# Altium integrated library 00Lib.IntLib: 286 symbols (part 2 of 2) (continued)
## STM32G431C6T6
designator U?
No Description Available; Manufacturer: ST(意法半导体); CompType: MCU; Code: STM32G431C6T6; DistributorCode: C529354; Package: LQFP-48
footprint LQFP48-7x7mm
part A pins: 2 PC13 (io), 3 PC14-OSC32_IN (io), 4 PC15-OSC32_OUT (io), 5 PF0-OSC_IN (io), 6 PF1-OSC_OUT (io), 7 PG10-NRST (io), 8 PA0 (io), 9 PA1 (io), 10 PA2 (io), 11 PA3 (io), 12 PA4 (io), 13 PA5 (io), 14 PA6 (io), 15 PA7 (io), 16 PB0 (io), 17 PB1 (io), 18 PB2 (io), 22 PB10 (io), 25 PB11 (io), 26 PB12 (io), 27 PB13 (io), 28 PB14 (io), 29 PB15 (io), 30 PA8 (io), 31 PA9 (io), 32 PA10 (io), 33 PA11 (io), 34 PA12 (io), 37 PA13 (io), 38 PA14 (io), 39 PA15 (io), 40 PB3 (io), 41 PB4 (io), 42 PB5 (io), 43 PB6 (io), 44 PB7 (io), 45 PB8-BOOT0 (io), 46 PB9 (io)
part B pins: 1 VBAT (power), 19 VSSA (power), 20 VREF+ (power), 21 VDDA (power), 23 VSS (power), 24 VDD (power), 35 VSS (power), 36 VDD (power), 47 VSS (power), 48 VDD (power)
part A text: 1 of 2
part B text: 2 of 2

## STM32G431CBT6
designator U?
No Description Available; Manufacturer: ST(意法半导体); Code: STM32G431CBT6A; CompType: MCU; DistributorCode: C529354; Package: LQFP-48
footprint LQFP48-7x7mm
part A pins: 2 PC13 (io), 3 PC14-OSC32_IN (io), 4 PC15-OSC32_OUT (io), 5 PF0-OSC_IN (io), 6 PF1-OSC_OUT (io), 7 PG10-NRST (io), 8 PA0 (io), 9 PA1 (io), 10 PA2 (io), 11 PA3 (io), 12 PA4 (io), 13 PA5 (io), 14 PA6 (io), 15 PA7 (io), 16 PB0 (io), 17 PB1 (io), 18 PB2 (io), 22 PB10 (io), 25 PB11 (io), 26 PB12 (io), 27 PB13 (io), 28 PB14 (io), 29 PB15 (io), 30 PA8 (io), 31 PA9 (io), 32 PA10 (io), 33 PA11 (io), 34 PA12 (io), 37 PA13 (io), 38 PA14 (io), 39 PA15 (io), 40 PB3 (io), 41 PB4 (io), 42 PB5 (io), 43 PB6 (io), 44 PB7 (io), 45 PB8-BOOT0 (io), 46 PB9 (io)
part B pins: 1 VBAT (power), 19 VSSA (power), 20 VREF+ (power), 21 VDDA (power), 23 VSS (power), 24 VDD (power), 35 VSS (power), 36 VDD (power), 47 VSS (power), 48 VDD (power)
part B text: 2 of 2

## STM32G431KBT6
designator U?
No Description Available; Manufacturer: ST(意法半导体); CompType: MCU; Code: STM32G431KBT6; DistributorCode: C529357; Package: LQFP-32
footprint LQFP-32
part A pins: 2 PF0-OSC_IN (io), 3 PF1-OSC_OUT (io), 4 PG10-NRST (io), 5 PA0 (io), 6 PA1 (io), 7 PA2 (io), 8 PA3 (io), 9 PA4 (io), 10 PA5 (io), 11 PA6 (io), 12 PA7 (io), 13 PB0 (io), 18 PA8 (io), 19 PA9 (io), 20 PA10 (io), 21 PA11 (io), 22 PA12 (io), 23 PA13 (io), 24 PA14 (io), 25 PA15 (io), 26 PB3 (io), 27 PB4 (io), 28 PB5 (io), 29 PB6 (io), 30 PB7 (io), 31 PB8-BOOT0 (io)
part B pins: 1 VDD (power), 14 VSSA (power), 15 VDDA (power), 16 VSS (power), 17 VDD (power), 32 VSS (power)
part A text: 1 of 2
part B text: 2 of 2

## STM32G431KBU6
designator U?
No Description Available; Manufacturer: ST(意法半导体); CompType: MCU; Code: STM32G431KBU6; DistributorCode: C529358; Package: UFQFPN-32
footprint UFQFPN-32
part A pins: 2 PF0-OSC_IN (io), 3 PF1-OSC_OUT (io), 4 PG10-NRST (io), 5 PA0 (io), 6 PA1 (io), 7 PA2 (io), 8 PA3 (io), 9 PA4 (io), 10 PA5 (io), 11 PA6 (io), 12 PA7 (io), 13 PB0 (io), 18 PA8 (io), 19 PA9 (io), 20 PA10 (io), 21 PA11 (io), 22 PA12 (io), 23 PA13 (io), 24 PA14 (io), 25 PA15 (io), 26 PB3 (io), 27 PB4 (io), 28 PB5 (io), 29 PB6 (io), 30 PB7 (io), 31 PB8-BOOT0 (io)
part B pins: 1 VDD (power), 14 VSSA (power), 15 VDDA (power), 16 VSS (power), 17 VDD (power), 32 VSS (power)
part A text: 1 of 2
part B text: 2 of 2

## STM32G431VBT6
designator U?
No Description Available; Manufacturer: ST(意法半导体); CompType: MCU; Code: STM32G431VBT6; DistributorCode: C529359; Package: LQFP-100
footprint LQFP100-14x14mm
part A pins: 7 PC13 (io), 8 PC14-OSC32_IN (io), 9 PC15-OSC32_OUT (io), 15 PC0 (io), 16 PC1 (io), 17 PC2 (io), 18 PC3 (io), 20 PA0 (io), 21 PA1 (io), 22 PA2 (io), 25 PA3 (io), 26 PA4 (io), 27 PA5 (io), 28 PA6 (io), 29 PA7 (io), 30 PC4 (io), 31 PC5 (io), 32 PB0 (io), 33 PB1 (io), 34 PB2 (io), 47 PB10 (io), 50 PB11 (io), 51 PB12 (io), 52 PB13 (io), 53 PB14 (io), 54 PB15 (io), 55 PD8 (io), 56 PD9 (io), 57 PD10 (io), 58 PD11 (io), 59 PD12 (io), 60 PD13 (io), 61 PD14 (io), 62 PD15 (io), 65 PC6 (io), 66 PC7 (io), 67 PC8 (io), 68 PC9 (io), 69 PA8 (io), 70 PA9 (io), 71 PA10 (io), 72 PA11 (io), 73 PA12 (io), 76 PA13 (io), 77 PA14 (io), 78 PA15 (io), 79 PC10 (io), 80 PC11 (io), 81 PC12 (io), 82 PD0 (io), 83 PD1 (io), 84 PD2 (io), 85 PD3 (io), 86 PD4 (io), 87 PD5 (io), 88 PD6 (io), 89 PD7 (io), 90 PB3 (io), 91 PB4 (io), 92 PB5 (io), 93 PB6 (io), 94 PB7 (io), 95 PB8-BOOT0 (io), 96 PB9 (io)
part B pins: 1 PE2 (io), 2 PE3 (io), 3 PE4 (io), 4 PE5 (io), 5 PE6 (io), 10 PF9 (io), 11 PF10 (io), 12 PF0-OSC_IN (io), 13 PF1-OSC_OUT (io), 14 PG10-NRST (io), 19 PF2 (io), 38 PE7 (io), 39 PE8 (io), 40 PE9 (io), 41 PE10 (io), 42 PE11 (io), 43 PE12 (io), 44 PE13 (io), 45 PE14 (io), 46 PE15 (io), 97 PE0 (io), 98 PE1 (io)
part C pins: 6 VBAT (power), 23 VSS (power), 24 VDD (power), 35 VSSA (power), 36 VREF+ (power), 37 VDDA (power), 48 VSS (power), 49 VDD (power), 63 VSS (power), 64 VDD (power), 74 VSS (power), 75 VDD (power), 99 VSS (power), 100 VDD (power)
part A text: 1 of 3
part B text: 2 of 3
part C text: 3 of 3

## TLP521GB-S
designator O?, comment TLP521
光耦; Manufacturer: UMW(友台半导体); Code: TLP521GB-S; DistributorCode: C364143; Package: SMD-4P; A_Code: -; A_Manufacturer: -; CompType: 光耦; A_ComType: -
footprint DIP-4 (DIP; 4 Leads; Row Spacing 7.62 mm; Pitch 2.54 mm)
footprint SMD-4
pins: 1 A "Anode", 2 K "Cathode", 3 E "Emitter", 4 C "Collector"

## TPL5010DDCR
designator U?
看门狗; Manufacturer: TI(德州仪器); Code: TPL5010DDCR; DistributorCode: C473912; Package: SOT23-Thin-6; CompType: 看门狗; A_Code: -; A_ComType: -; A_Manufacturer: -
footprint DDC0006A_N
pins: 1 VDD (power), 2 GND (power), 3 DELAY_M_RST (in), 4 DONE (in), 5 WAKE (out), 6 RST_N (out)

## TPS22860DBVR
designator U?
负载开关; Manufacturer: TI(德州仪器); CompType: 模拟开关; Code: TPS22860DBVR; DistributorCode: C132005; Package: SOT23-6
footprint DBV0006A_N
pins: 1 VOUT (power), 2 GND (power), 3 NC, 4 VIN (power), 5 VBIAS (in), 6 ON (in)

## ULN2003BDR
designator U?
footprint D16_TEX
pins: 1 1B (in), 2 2B (in), 3 3B (in), 4 4B (in), 5 5B (in), 6 6B (in), 7 7B (in), 8 E, 9 COM, 10 7C (out), 11 6C (out), 12 5C (out), 13 4C (out), 14 3C (out), 15 2C (out), 16 1C (out)

## W25Q16
designator U?
存储器接口类型 SPI-双/四通道I / O / 存储器容量 16Mb（2M x 8） / 工作电压 2.7V〜3.6V / 存储器类型 非易失性; Manufacturer: WINBOND(华邦); Code: W25Q16JVSSIQ; CompType: FLASH存储器; DistributorCode: C82317; Package: SOIC-8; A_Code: -; A_ComType: -; A_Manufacturer: -
footprint D8_TEX
pins: 1 ~{CS} (power), 2 DO/IO1 (power), 3 IO2 (power), 4 VSS, 5 DI/IO0, 6 CLK, 7 IO3, 8 VDD


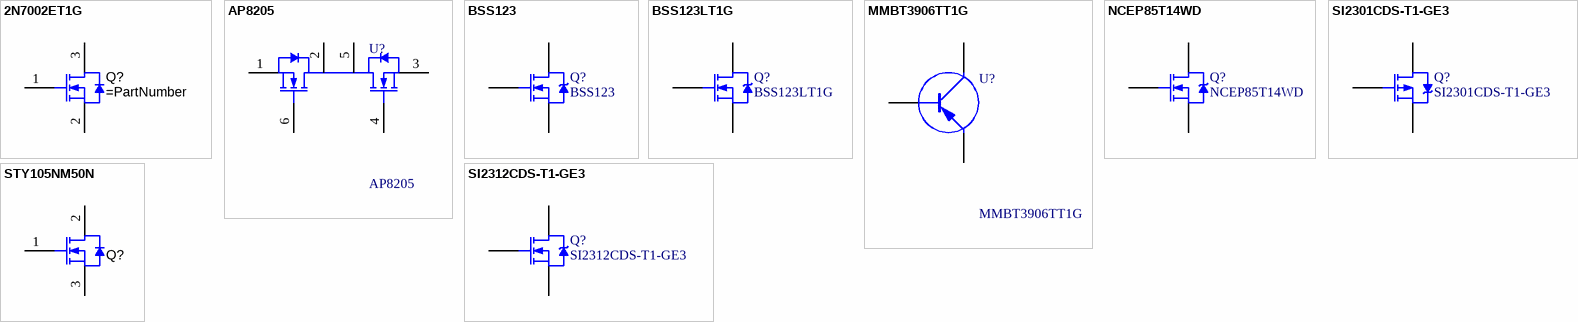
[diagram p10: symbols 2N7002ET1G to STY105NM50N]

## 2N7002ET1G
designator Q?
MOSFET, N-CH, 60V, 0.26A, SOT-23; Manufacturer: ON Semiconductor; Code: 2N7002ET1G; CompType: MOSFET; Package: SOT-23-3
footprint SOT-23 (SOT23, 3-Leads, Body 2.9x1.3mm, Pitch 0.95mm, Lead Span 2.5mm, IPC Medium Density)
pins: 1 G, 2 S, 3 D

## AP8205
designator U?
漏源电压（Vdss） 20V / 连续漏极电流（Id）（25°C 时） 6A / 栅源极阈值电压 1.2V @ 250uA / 漏源导通电阻 24mΩ @ 6A,4.5V / 最大功率耗散（Ta=25°C） 1.14W / 类型 双N沟道(共漏); Manufacturer: ALLPOWER(铨力); CompType: MOS(场效应管); Code: AP8205; DistributorCode: C360340; Package: SOT23-6
footprint DBV0006A_N
pins: 1 S1, 2 D1/D2, 3 S2, 4 G2, 5 D1/D2, 6 G1

## BSS123
designator Q?
漏源电压（Vdss） 100V / 连续漏极电流（Id）（25°C 时） 170mA / 栅源极阈值电压 2V @ 1mA / 漏源导通电阻 6Ω @ 170mA,10V / 最大功率耗散（Ta=25°C） 360mW / 类型 N沟道 /; Manufacturer: CJ（江苏长电/长晶）; CompType: MOS(场效应管); A_Code: -; A_Manufacturer: -; Code: BSS123; DistributorCode: C79015; Package: SOT-23-3; A_ComType: -
footprint SOT-23
pins: 1 G, 2 S, 3 D

## BSS123LT1G
designator Q?
漏源电压（Vdss） 100V / 连续漏极电流（Id）（25°C 时） 170mA / 栅源极阈值电压 2.8V @ 1mA / 漏源导通电阻 6Ω @ 100mA,10V / 最大功率耗散（Ta=25°C） 225mW / 类型 N沟道; Manufacturer: ON(安森美); Code: BSS123; CompType: MOS(场效应管); A_Code: -; A_Manufacturer: -; DistributorCode: C78755; Package: SOT-23-3; A_ComType: -
footprint SOT-23
pins: 1 G, 2 S, 3 D

## MMBT3906TT1G
designator U?
额定功率 200mW / 集电极电流Ic 200mA / 集射极击穿电压Vce 40V / 晶体管类型 PNP; Manufacturer: ON(安森美); Code: MMBT3906TT1G; DistributorCode: C82042; Package: SOT23-3; CompType: PNP
footprint SOT-23(SOT-23-3)
pins: 1 B, 2 E, 3 C

## NCEP85T14WD
designator Q?
漏源电压（Vdss） 85V / 连续漏极电流（Id）（25°C 时） 140A / 栅源极阈值电压 3.1V @ 250uA / 漏源导通电阻 4mΩ @ 70A,10V / 最大功率耗散（Ta=25°C） 360mW / 类型 N沟道 /; Manufacturer: 无锡新洁能; CompType: MOS(场效应管); A_Code: -; A_Manufacturer: -; Code: NCEP85T14WD; DistributorCode: -; Package: TO-263-2L; A_ComType: -
footprint TO-263T-2L (D2-PAK, 3-Pads, Body 7.80x8.50mm (max), IPC Medium Density)
pins: 1 G, 2 S, 3 D

## SI2301CDS-T1-GE3
designator Q?
漏源电压（Vdss） -20V / 连续漏极电流（Id）（25°C 时） 3.1A / 栅源极阈值电压 1V @ 250uA / 漏源导通电阻 112mΩ @ 2.8A,4.5V / 最大功率耗散（Ta=25°C） 860mW / 类型 P沟道; Manufacturer: VISHAY(威世); CompType: MOS(场效应管); A_Code: -; A_Manufacturer: -; Code: SI2301CDS-T1-GE3; DistributorCode: C10487; Package: SOT-23-3; A_ComType: -
footprint SOT-23(SOT-23-3)
pins: 1 G, 2 S, 3 D

## SI2312CDS-T1-GE3
designator Q?
漏源电压（Vdss） 20V / 连续漏极电流（Id）（25°C 时） 6A(Tc) / 栅源极阈值电压 1V @ 250uA / 漏源导通电阻 31.8mΩ @ 5A,4.5V / 最大功率耗散（Ta=25°C） 2.1W(Tc) / 类型 N沟道; Manufacturer: VISHAY(威世); CompType: MOS(场效应管); A_Code: -; A_Manufacturer: -; Code: SI2312CDS-T1-GE3; DistributorCode: C142518; Package: SOT-23-3; A_ComType: -
footprint SOT-23(SOT-23-3)
pins: 1 G, 2 S, 3 D

## STY105NM50N
designator Q?, comment STY145N65M5  (value not drawn)
MOSFET N-CH 650V 138A MAX247; Manufacturer: STMicroelectronics; Alternate Manufacturer: None; U/M: EA; ChType: N; VdsMax_V: 650; Value1: ? ohm; Value2: 326 nC; QgTyp_nC: 326; IdsMax_A: 110; AEC Category: Q101; SymbolVersion: 2008-07-28; CompType: MOSFET; PartNumber: STY145N65M5; PackageReference: TO-247; Value: 650V; RoHS: Y; MountType: TH; Published: 2008-06-19; Publisher: Texas Instruments; LatestRevisionDate: 2016-03-28; LatestRevisionNote: Added parts.; ComponentLink1Description: Datasheet link; Supplier 1: Digi-Key; Supplier Part Number 1: 497-13638-5-ND; AEC Qualified: N
footprint TO-247
pins: 1 G, 2 D, 3 S
1 alternate drawing of the same symbol


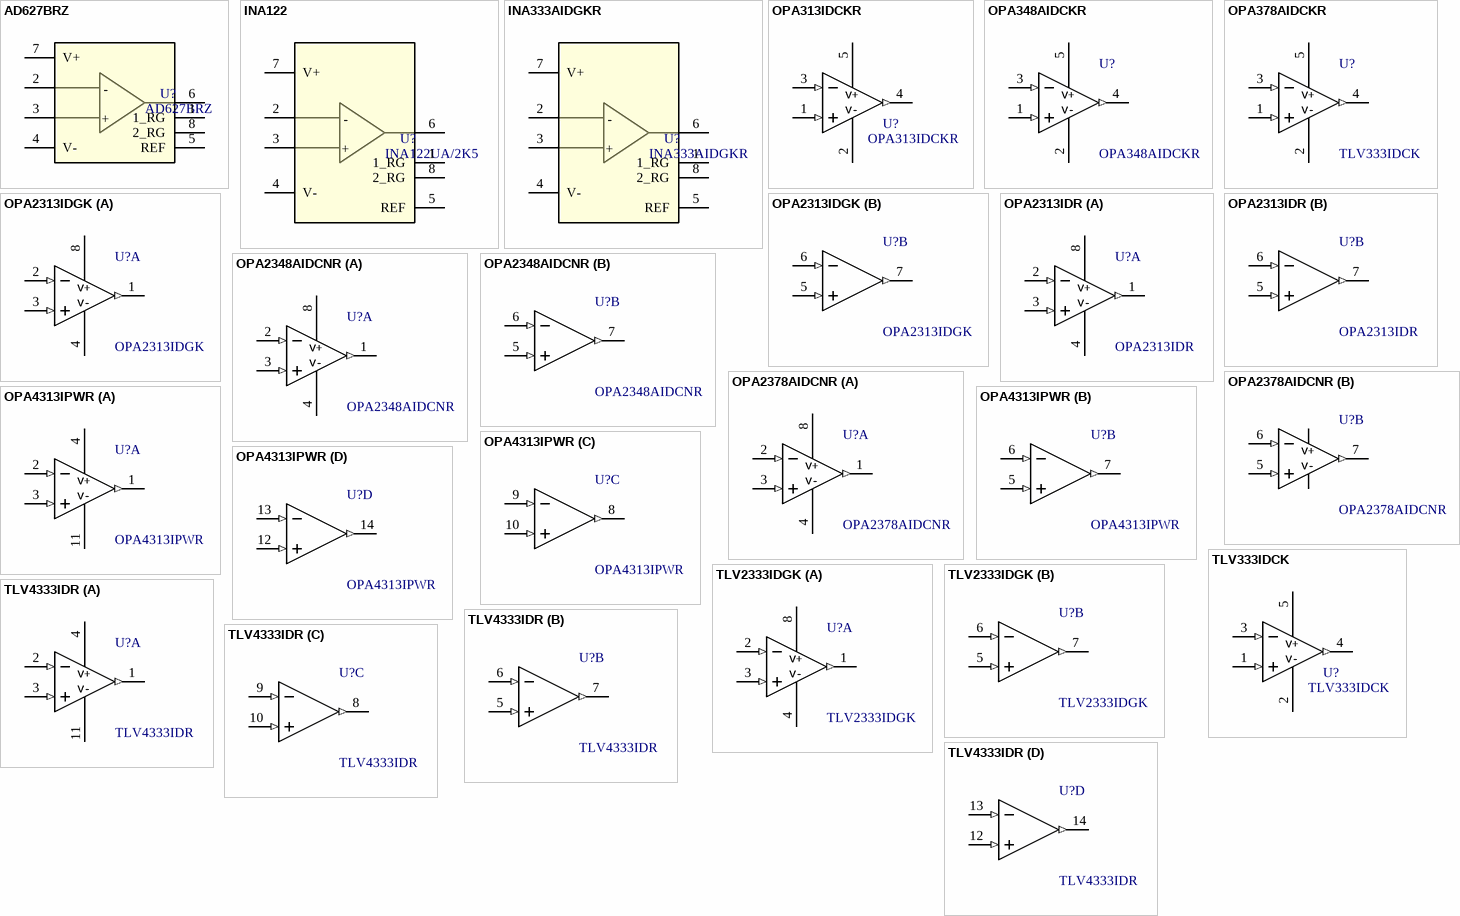
[diagram p11: symbols AD627BRZ to TLV4333IDR]

## AD627BRZ
designator U?
增益带宽积（GBP） 80kHz(-3dB) / 放大器组数 1 / 输出类型 Rail-to-Rail / 运放类型 Instrumentation / 各通道功耗 - / 压摆率（SR） 0.06 V/us / 工作温度 -40℃~85℃ / 电源电压 2.2V ~ 36V, ±1.1V ~ 18V; Manufacturer: TI(德州仪器); CompType: 运放; DistributorCode: C19137; Package: SOIC-8_150mil; Code: AD627BRZ; A_Code: -; A_Manufacturer: -; A_ComType: -
footprint SOP-8_150mil
pins: 1 1_RG, 2 VIN- (hiz), 3 VIN+ (hiz), 4 V- (power), 5 REF, 6 VOUT, 7 V+ (power), 8 2_RG
text: +

## INA122
designator U?, comment INA122UA/2K5
放大器组数 1 / 输出类型 - / 运放类型 Instrumentation / 各通道功耗 60uA / 压摆率（SR） 0.16 V/us / 工作温度 -40℃~85℃ / 电源电压 2.2V ~ 36V, -0.9V/+1.3V ~ 18V /; Manufacturer: TI(德州仪器); CompType: 运放; DistributorCode: C40768; Package: SOIC-8_150mil; Code: INA122UA/2K5; A_Code: -; A_Manufacturer: -; A_ComType: -
footprint SOP-8_150mil
pins: 1 1_RG, 2 VIN- (hiz), 3 VIN+ (hiz), 4 V- (power), 5 REF, 6 VOUT, 7 V+ (power), 8 2_RG
text: +

## INA333AIDGKR
designator U?
输出类型 Rail-to-Rail / 运放类型 Instrumentation / 各通道功耗 75uA / 压摆率（SR） 0.16 V/us / 工作温度 -40°C ~ 125°C / 电源电压 1.8V ~ 5.5V, ±0.9V ~ 2.75V; Manufacturer: TI(德州仪器); CompType: 运放; DistributorCode: C19450; Package: VSSOP8; Code: INA333AIDGKR; A_Code: -; A_Manufacturer: -; A_ComType: -
footprint DGK8_TEX-L
pins: 1 1_RG, 2 VIN- (hiz), 3 VIN+ (hiz), 4 V- (power), 5 REF, 6 VOUT, 7 V+ (power), 8 2_RG
text: +

## OPA313IDCKR
designator U?
增益带宽积（GBP） 1MHz / 放大器组数 1 / 输出类型 Rail-to-Rail / 运放类型 General Purpose / 各通道功耗 50uA / 压摆率（SR） 0.5 V/us / 工作温度 -40°C ~ 125°C / 电源电压 1.8V ~ 5.5V; Manufacturer: TI(德州仪器); CompType: 运放; DistributorCode: C129150; Package: SC-70-5; Code: OPA313IDCKR; A_Code: -; A_Manufacturer: -; A_ComType: -
footprint DCK0005A_N
pins: 1 IN+ (in), 2 V- (power), 3 IN- (in), 4 OUT (out), 5 V+ (power)

## OPA348AIDCKR
designator U?
增益带宽积（GBP） 1MHz / 放大器组数 1 / 输出类型 Rail-to-Rail / 运放类型 General Purpose / 各通道功耗 - / 压摆率（SR） 0.5 V/us / 工作温度 -40°C ~ 125°C / 电源电压 2.1V ~ 5.5V; Manufacturer: TI(德州仪器); CompType: 运放; DistributorCode: C353160; Package: SC-70-5; Code: OPA348AIDCKR
footprint DCK0005A_N
pins: 1 IN+ (in), 2 V- (power), 3 IN- (in), 4 OUT (out), 5 V+ (power)

## OPA378AIDCKR
designator U?, comment TLV333IDCK
Manufacturer: TI(德州仪器); Code: OPA378AIDCKR; CompType: 运放; DistributorCode: C2058269; Package: SC-70-5
footprint DCK0005A_N
pins: 1 IN+ (in), 2 V- (power), 3 IN- (in), 4 OUT (out), 5 V+ (power)

## OPA2313IDGK
designator U?
增益带宽积（GBP） 1MHz / 放大器组数 2 / 输出类型 Rail-to-Rail / 运放类型 General Purpose / 各通道功耗 50uA / 压摆率（SR） 0.5 V/us / 工作温度 -40°C ~ 125°C / 电源电压 1.8V ~ 5.5V; Manufacturer: TI(德州仪器); CompType: 运放; DistributorCode: C1347995; Package: VSSOP-8; Code: OPA2313IDGK
footprint DGK8_TEX-L
part A pins: 1 OUT (out), 2 IN- (in), 3 IN+ (in), 4 V- (power), 8 V+ (power)
part B pins: 5 IN+ (in), 6 IN- (in), 7 OUT (out)

## OPA2313IDR
designator U?
增益带宽积（GBP） 1MHz / 放大器组数 2 / 输出类型 Rail-to-Rail / 运放类型 General Purpose / 各通道功耗 50uA / 压摆率（SR） 0.5 V/us / 工作温度 -40°C ~ 125°C / 电源电压 1.8V ~ 5.5V; Manufacturer: TI(德州仪器); CompType: 运放; DistributorCode: C132028; Package: SOIC-8; Code: OPA2313IDR
footprint SOP-8_150mil
part A pins: 1 OUT (out), 2 IN- (in), 3 IN+ (in), 4 V- (power), 8 V+ (power)
part B pins: 5 IN+ (in), 6 IN- (in), 7 OUT (out)

## OPA2348AIDCNR
designator U?
增益带宽积（GBP） 1MHz / 放大器组数 2 / 输出类型 Rail-to-Rail / 运放类型 General Purpose / 各通道功耗 - / 压摆率（SR） 0.5 V/us / 工作温度 -40°C ~ 125°C / 电源电压 2.1V ~ 5.5V; Manufacturer: TI(德州仪器); CompType: 运放; DistributorCode: C51564; Package: SOT-23-8; Code: OPA2348AIDCNR
footprint DCN8-L
part A pins: 1 OUT (out), 2 IN- (in), 3 IN+ (in), 4 V- (power), 8 V+ (power)
part B pins: 5 IN+ (in), 6 IN- (in), 7 OUT (out)

## OPA2378AIDCNR
designator U?
增益带宽积（GBP） 900kHz / 放大器组数 2 / 输出类型 Rail-to-Rail / 运放类型 Zero-Drift / 各通道功耗 - / 压摆率（SR） 0.4 V/us / 工作温度 -40°C ~ 125°C / 电源电压 2.2V ~ 5.5V, ±1.1V ~ 2.75V; Manufacturer: TI(德州仪器); CompType: 运放; DistributorCode: C133030; Package: VSSOP-8; Code: OPA2378AIDCNR
footprint DCN8-L
part A pins: 1 OUT (out), 2 IN- (in), 3 IN+ (in), 4 V- (power), 8 V+ (power)
part B pins: 5 IN+ (in), 6 IN- (in), 7 OUT (out)

## OPA4313IPWR
designator U?
电源电压 1.8V ~ 5.5V, ±0.9V ~ 2.75V / 增益带宽积（GBP） 350kHz / 压摆率（SR） 0.16 V/us / 工作温度 -40°C ~ 125°C; Manufacturer: TI(德州仪器); CompType: 运放; DistributorCode: C2057614; Package: TSSOP-14; Code: OPA4313IPWR
footprint PW14_TEX-L
part A pins: 1 OUT (out), 2 IN- (in), 3 IN+ (in), 4 V+ (power), 11 V- (power)
part B pins: 5 IN+ (in), 6 IN- (in), 7 OUT (out)
part C pins: 8 OUT (out), 9 IN- (in), 10 IN+ (in)
part D pins: 12 IN+ (in), 13 IN- (in), 14 OUT (out)

## TLV333IDCK
designator U?
电源电压 1.8V ~ 5.5V, ±0.9V ~ 2.75V / 增益带宽积（GBP） 350kHz / 压摆率（SR） 0.16 V/us / 工作温度 -40°C ~ 125°C /; Manufacturer: TI(德州仪器); CompType: 运放; DistributorCode: C181502; Package: SC-70-5; Code: TLV333IDCK; A_Code: -; A_Manufacturer: -; A_ComType: -
footprint DCK0005A_N
pins: 1 IN+ (in), 2 V- (power), 3 IN- (in), 4 OUT (out), 5 V+ (power)

## TLV2333IDGK
designator U?
电源电压 1.8V ~ 5.5V, ±0.9V ~ 2.75V / 增益带宽积（GBP） 350kHz / 压摆率（SR） 0.16 V/us / 工作温度 -40°C ~ 125°C; Manufacturer: TI(德州仪器); Code: TLV2333IDGKR; CompType: 运放; DistributorCode: C527573; Package: VSSOP-8
footprint DGK8_TEX-L
part A pins: 1 OUT (out), 2 IN- (in), 3 IN+ (in), 4 V- (power), 8 V+ (power)
part B pins: 5 IN+ (in), 6 IN- (in), 7 OUT (out)

## TLV4333IDR
designator U?
电源电压 1.8V ~ 5.5V, ±0.9V ~ 2.75V / 增益带宽积（GBP） 350kHz / 压摆率（SR） 0.16 V/us / 工作温度 -40°C ~ 125°C; Manufacturer: TI(德州仪器); CompType: 运放; DistributorCode: C140298; Package: SOIC-14; Code: TLV4333IDR
footprint D14
part A pins: 1 OUT (out), 2 IN- (in), 3 IN+ (in), 4 V+ (power), 11 V- (power)
part B pins: 5 IN+ (in), 6 IN- (in), 7 OUT (out)
part C pins: 8 OUT (out), 9 IN- (in), 10 IN+ (in)
part D pins: 12 IN+ (in), 13 IN- (in), 14 OUT (out)


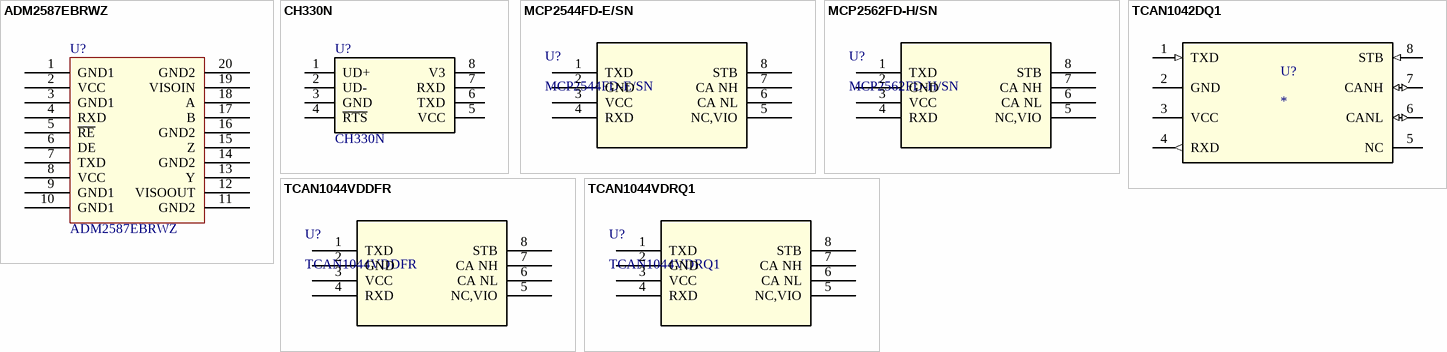
[diagram p12: symbols ADM2587EBRWZ to TCAN1044VDRQ1]

## ADM2587EBRWZ
designator U?
协议类别 RS422, RS485 / 电源电压 3.3V, 5V / 数据速率 500kbps; Manufacturer: ADI(亚德诺); Code: ADM2587EBRWZ-REEL7; CompType: 隔离485; DistributorCode: C12081; Package: WSOIC-20; A_Code: -; A_ComType: -; A_Manufacturer: -
footprint SO20/1.27_12.8*7.5
pins: 1 GND1, 2 VCC, 3 GND1, 4 RXD, 5 ~{RE}, 6 DE, 7 TXD, 8 VCC, 9 GND1, 10 GND1, 11 GND2, 12 VISOOUT, 13 Y, 14 GND2, 15 Z, 16 GND2, 17 B, 18 A, 19 VISOIN, 20 GND2

## CH330N
designator U?
驱动器/接收器数 - / 协议类别 USB 2.0 / 类型 Transceiver / 电源电压 3.3V, 5V / 数据速率 2Mbps; Manufacturer: WCH(南京沁恒); CompType: USB转UART; Code: CH330N; DistributorCode: C108996; Package: SOIC-8; A_Code: -; A_ComType: -; A_Manufacturer: -
footprint D8_TEX
pins: 1 UD+, 2 UD-, 3 GND, 4 ~{RTS}, 5 VCC, 6 TXD, 7 RXD, 8 V3

## MCP2544FD-E/SN
designator U?
收发器 / 驱动器/接收器数 1/1 / 协议类别 CAN总线 / 电源电压 4.5V ~ 5.5V / 数据速率 8Mbps; Manufacturer: MICROCHIP(美国微芯); CompType: CAN芯片; Code: MCP2544FD-E/SN; DistributorCode: C191256; Package: SOIC-8
footprint D8_TEX
pins: 1 TXD, 2 GND, 3 VCC (power), 4 RXD, 5 NC,VIO, 6 CA NL, 7 CA NH, 8 STB

## MCP2562FD-H/SN
designator U?
收发器 / 驱动器/接收器数 1/1 / 协议类别 CAN总线 / 电源电压 4.5V ~ 5.5V / 数据速率 8Mbps; Manufacturer: MICROCHIP(美国微芯); CompType: CAN芯片; Code: MCP2562FD-H/SN; DistributorCode: C191415; Package: SOIC-8
footprint D8_TEX
pins: 1 TXD, 2 GND, 3 VCC (power), 4 RXD, 5 NC,VIO, 6 CA NL, 7 CA NH, 8 STB

## TCAN1042DQ1
designator U?
收发器 / 驱动器/接收器数 1/1 / 协议类别 CAN总线 / 电源电压 4.5V ~ 5.5V / 数据速率 2Mbps; Manufacturer: TI(德州仪器); Code: TCAN1042DRQ1; CompType: CAN芯片; DistributorCode: C118837; Package: SOIC-8
footprint D8_TEX
pins: 1 TXD (in), 2 GND (power), 3 VCC (power), 4 RXD (out), 5 NC, 6 CANL (io), 7 CANH (io), 8 STB (in)

## TCAN1044VDDFR
designator U?
No Description Available; Manufacturer: TI(德州仪器); CompType: CAN芯片; Code: TCAN1044VDDFR; DistributorCode: C1855774; Package: SOT-23-8
footprint SOIC_4VDDFR_TEX-L
pins: 1 TXD, 2 GND, 3 VCC (power), 4 RXD, 5 NC,VIO, 6 CA NL, 7 CA NH, 8 STB

## TCAN1044VDRQ1
designator U?
No Description Available; Manufacturer: TI(德州仪器); CompType: CAN芯片; Code: TCAN1044VDRQ1; DistributorCode: C1852061; Package: SOIC-8
footprint D8_TEX
pins: 1 TXD, 2 GND, 3 VCC (power), 4 RXD, 5 NC,VIO, 6 CA NL, 7 CA NH, 8 STB


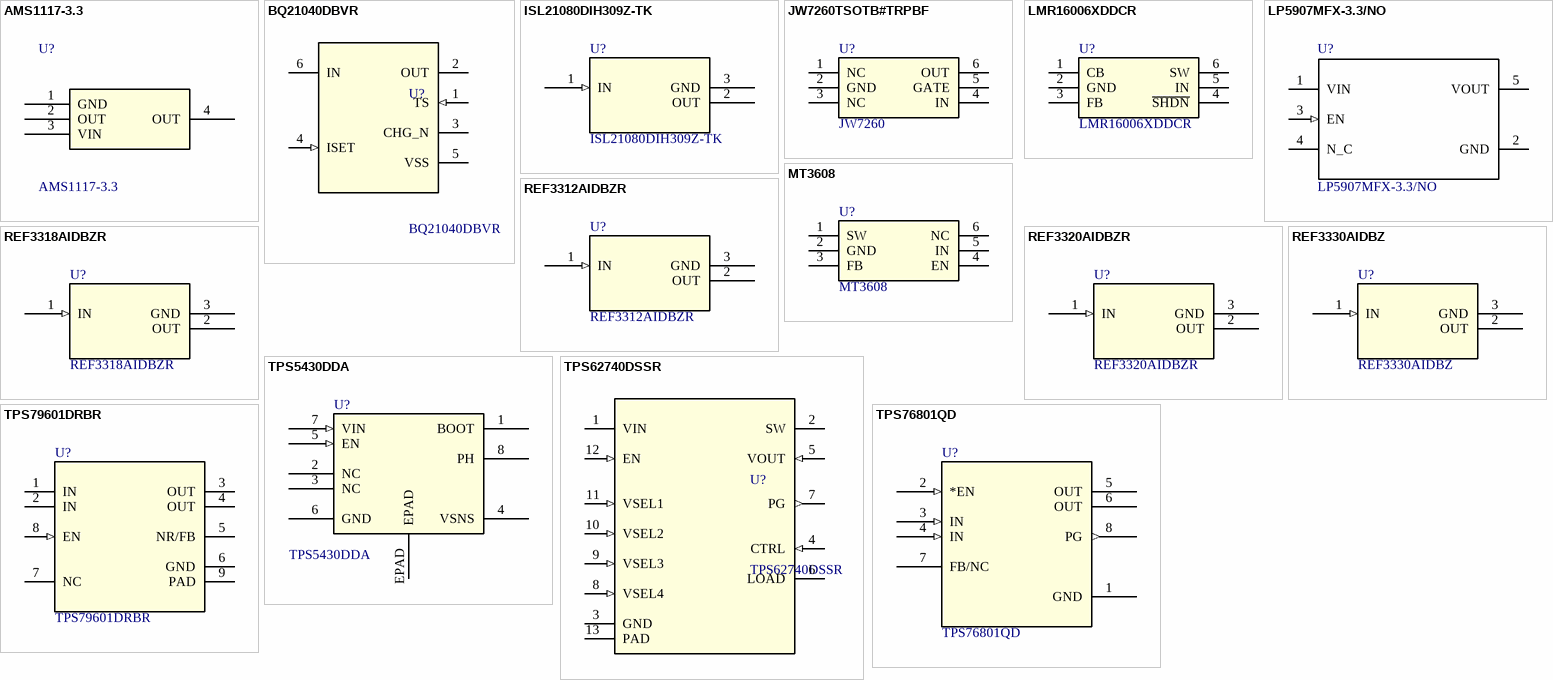
[diagram p13: symbols AMS1117-3.3 to TPS79601DRBR]

## AMS1117-3.3
designator U?
最大输入电压 15V / 压降(max) 1.3V @ 800mA / 输出电压(可调) - / 静态电流(Iq) - / 最大输出电流 1A / 工作电源电流(Max) - / 输出配置 正 / 纹波抑制(PSRR) 72dB(120Hz) / 输出类型 固定 / 输出通道数 1 / 工作温度 -40℃ ~ 125℃(TJ) / 使能脚 - / 输出电压(固定) 3.3V; Manufacturer: AMS; CompType: LDO; Code: AMS1117-3.3; DistributorCode: C6186; Package: SOT-223
footprint SOT223_L (SOT223, 4-Leads, Body 6.5x3.5mm, Pitch 2.3mm, Lead Span 7mm, IPC High Density)
pins: 1 GND (power), 2 OUT (power), 3 VIN, 4 OUT (power)

## BQ21040DBVR
designator U?
充电芯片; Manufacturer: TI(德州仪器); CompType: 电池电源管理; Code: BQ21040DBVR; DistributorCode: C202311; Package: SOT23-6
footprint USOT23-6
pins: 1 TS (in), 2 OUT (power), 3 CHG_N (oc), 4 ISET (in), 5 VSS (power), 6 IN (power)

## ISL21080DIH309Z-TK
designator U?
输出电压（最小值/固定） 0.9V / 输出电流 7mA / 输出电压（最大值） - / 输入电压 2 V ~ 5.5 V / 电源电流 1.5uA / 输出类型 固定 / 工作温度 -40°C ~ 85°C(TA) / 温度系数 50ppm/°C / 阴极电流 - / 精度 ±0.7% / 参考源类型 系列; Manufacturer: Intersil(英特矽尔); CompType: 电源参考; DistributorCode: C152443; Package: SOT23-3; Code: ISL21080DIH309Z-TK
footprint SOT-23(SOT-23-3)
pins: 1 IN (in), 2 OUT (power), 3 GND (power)

## JW7260TSOTB#TRPBF
designator U?, comment JW7260
High-side Single ORing Controller; Manufacturer: 杰华特; Code: JW7260TSOTB#TRPBF; DistributorCode: -; Package: SOT23-6; A_Code: -; A_Manufacturer: -; CompType: Oring; A_ComType: -
footprint DDC0006A_N
pins: 1 NC (power), 2 GND (power), 3 NC (power), 4 IN, 5 GATE, 6 OUT

## LMR16006XDDCR
designator U?
DC-DC芯片; Manufacturer: TI(德州仪器); Code: LMR16006XDDCR; DistributorCode: C87080; Package: SOT23-6; A_Code: -; A_Manufacturer: -; CompType: DC-DC芯片; A_ComType: -
footprint DDC0006A_N
pins: 1 CB (power), 2 GND (power), 3 FB (power), 4 ~{SHDN}, 5 IN, 6 SW

## LP5907MFX-3.3/NO
designator U?
线性稳压器(LDO) / 工作电源电流(Max) 425μA / 最大输入电压 5.5V / 压降(max) 250mV @ 250mA / 输出电压(可调) - / 静态电流(Iq) - / 最大输出电流 250mA / 输出配置 正 / 纹波抑制(PSRR) 90dB ~ 60dB(100Hz ~ 100kHz) / 输出类型 固定 / 输出通道数 1 / 工作温度 -40°C ~ 125°C / 使能脚 - / 输出电压(固定) 3.3V; Manufacturer: TI(德州仪器); Code: LP5907MFX-3.3/NOPB; CompType: LDO; DistributorCode: C80670; Package: SOT-23-5
footprint SOT23-5
pins: 1 VIN (power), 2 GND (power), 3 EN (in), 4 N_C, 5 VOUT (power)

## MT3608
designator U?
DC-DC芯片 / 输出电压（最小值/固定） - / 输出电压（最大值） 28V / 可输出电流 - / 开关工作频率 1.2MHz / 输出类型 Adjustable / 输出电压的路数 1 / 最小输入电压 2V / 最大输入电压 24V / 电源拓扑结构 Boost / 同步整流与否 - / 功能类型 Step-Up / 输出配置 Positive; Manufacturer: 西安航天民芯; Code: MT3608; DistributorCode: C84817; Package: SOT23-6; A_Code: -; A_Manufacturer: -; CompType: DC-DC芯片; A_ComType: -
footprint DDC0006A_N
pins: 1 SW (power), 2 GND (power), 3 FB (power), 4 EN, 5 IN, 6 NC

## REF3312AIDBZR
designator U?
电压参考; Manufacturer: TI(德州仪器); CompType: 电源参考; DistributorCode: C183104; Package: SOT23-3; Code: REF3312AIDBZR
footprint SOT-23(SOT-23-3)
pins: 1 IN (in), 2 OUT (power), 3 GND (power)

## REF3318AIDBZR
designator U?
电压参考; Manufacturer: TI(德州仪器); CompType: 电源参考; DistributorCode: C115877; Package: SOT23-3; Code: REF3318AIDBZR
footprint SOT-23(SOT-23-3)
pins: 1 IN (in), 2 OUT (power), 3 GND (power)

## REF3320AIDBZR
designator U?
电压参考; Manufacturer: TI(德州仪器); CompType: 电源参考; DistributorCode: C527421; Package: SOT23-3; Code: REF3320AIDBZR
footprint SOT-23(SOT-23-3)
pins: 1 IN (in), 2 OUT (power), 3 GND (power)

## REF3330AIDBZ
designator U?
电压参考; Manufacturer: TI(德州仪器); CompType: 电源参考; DistributorCode: C140329; Package: SOT23-3; Code: REF3330AIDBZ
footprint SOT-23(SOT-23-3)
pins: 1 IN (in), 2 OUT (power), 3 GND (power)

## TPS5430DDA
designator U?
输出电压（最小值/固定） 1.221V / 输出电压（最大值） 32.04V / 可输出电流 3A / 开关工作频率 500kHz / 输出类型 Adjustable / 输出电压的路数 1 / 最小输入电压 5.5V / 最大输入电压 36V / 电源拓扑结构 Buck / 同步整流与否 No / 功能类型 Step-Down / 输出配置 Positive; Manufacturer: TI(德州仪器); Code: TPS5430DDAR; CompType: DC-DC芯片; DistributorCode: C9864; Package: SO PowerPAD-8; A_Code: -; A_ComType: -; A_Manufacturer: -
footprint DDA8_3P1X2P4
pins: 1 BOOT, 2 NC, 3 NC, 4 VSNS, 5 EN (in), 6 GND (power), 7 VIN (in), 8 PH, EPAD

## TPS62740DSSR
designator U?
DCDC; Manufacturer: TI(德州仪器); CompType: 电源芯片; DistributorCode: C128606; Package: DSS0012A; Code: TPS62740DSSR
footprint DSS0012A
pins: 1 VIN (power), 2 SW (power), 3 GND (power), 4 CTRL (in), 5 VOUT (in), 6 LOAD (power), 7 PG (out), 8 VSEL4 (in), 9 VSEL3 (in), 10 VSEL2 (in), 11 VSEL1 (in), 12 EN (in), 13 PAD (power)

## TPS76801QD
designator U?
线性稳压器(LDO) / 最大输入电压 10V / 压降(max) - / 输出电压(可调) 1.2V ~ 5.5V / 静态电流(Iq) - / 最大输出电流 1A / 输出配置 正 / 纹波抑制(PSRR) 60dB(1kHz) / 输出类型 可调 / 输出通道数 1 / 工作电源电流(Max) 125μA / 工作温度 -40℃ ~ 125℃(TJ); Manufacturer: TI(德州仪器); Code: TPS76801QDR; A_Code: -; A_Manufacturer: -; DistributorCode: C20030; Package: SOIC-8; CompType: 线性稳压器(LDO); A_ComType: -
footprint SOP-8_150mil
pins: 1 GND (power), 2 *EN (in), 3 IN (in), 4 IN (in), 5 OUT, 6 OUT, 7 FB/NC, 8 PG (out)

## TPS79601DRBR
designator U?
LDO; Manufacturer: TI(德州仪器); Code: TPS79601DRB; CompType: LDO; Package: VSON-8; DistributorCode: -; A_Code: -; A_ComType: -; A_Manufacturer: -
footprint DRB0008B
pins: 1 IN (power), 2 IN (power), 3 OUT (power), 4 OUT (power), 5 NR/FB, 6 GND (power), 7 NC, 8 EN (in), 9 PAD (power)